# Altium footprint library Connectors THD.PcbLib: 631 footprints (part 43 of 46) (continued)
## TYCO_1888250-1 [mm] "1 Port, Yellow/Green LEDs, RJ45 10/100Base-T, Cat 5, Ethernet Connector Module" (continued)
Drill Drawing:
  lines w0.1: -9.25,-8.355 -9.25,5 9.245,5 9.245,-8.355 -7.08,-8.355 -9.25,-8.355
  text "PRESS-FIT TECHNOLOGY" at -8.5,-10 h1
  text "Daimeter Tolerance" at -6.5,-11.5 h1
  text "+0.05/-0.05" at -4.5,-13 h1
3D body: height 8.48, standoff -5.3, extent -9.245,-22.515 9.245,4.22

## TYCO_5103310-5 [mm] "20 Contacts - Right Angle Double-Row .100'' x .100'' Low Profile Four-Wall Header, AMP-LATCH Serie"
height 9.14
pads (20):
  round 1.7 hole 1: 1(-11.43,-1.27) 2(-11.43,1.27) 3(-8.89,-1.27) 4(-8.89,1.27) 5(-6.35,-1.27) 6(-6.35,1.27) 7(-3.81,-1.27) 8(-3.81,1.27) 9(-1.27,-1.27) 10(-1.27,1.27) 11(1.27,-1.27) 12(1.27,1.27) 13(3.81,-1.27) 14(3.81,1.27) 15(6.35,-1.27) 16(6.35,1.27) 17(8.89,-1.27) 18(8.89,1.27) 19(11.43,-1.27) 20(11.43,1.27)
Top Overlay:
  circle w0.3: c-13.2,-1.27 r0.15
  lines w0.2: -13.97,2.057 -12.7,4.257 -11.656,2.449 ; -12.336,2.057 -15.367,2.057 -15.367,1.016 -16.51,1.016 -16.51,10.871 16.51,10.871 16.51,1.016 15.367,1.016 15.367,2.057 12.336,2.057 ; -2.604,10.871 cw(c-2.604,10.363) -2.096,10.363 -2.095,4.14 ccw(c-1.333,4.14) -1.333,3.378 1.333,3.378 ccw(c1.333,4.14) 2.095,4.17 2.095,10.363 cw(c2.604,10.363) 2.604,10.871 ; -2.095,4.394 2.095,4.394 ; -1.581,4.394 -1.581,10.49 -0.959,10.49 -0.959,4.394 ; 0.959,4.394 0.959,10.49 1.581,10.49 1.581,4.394
  text "20" at 12.915,0.207 h1.02
Mechanical 8:
  lines w0.1: -11.93,-1.27 -11.43,-1.27 ; -11.93,1.27 -11.43,1.27 ; -11.43,-1.77 -11.43,-1.27 ; -11.43,-0.77 -11.43,-1.27 ; -11.43,0.77 -11.43,1.27 ; -11.43,1.77 -11.43,1.27 ; -10.93,-1.27 -11.43,-1.27 ; -10.93,1.27 -11.43,1.27 ; -9.39,-1.27 -8.89,-1.27 ; -9.39,1.27 -8.89,1.27 ; -8.89,-1.77 -8.89,-1.27 ; -8.89,-0.77 -8.89,-1.27 ; -8.89,0.77 -8.89,1.27 ; -8.89,1.77 -8.89,1.27 ; -8.39,-1.27 -8.89,-1.27 ; -8.39,1.27 -8.89,1.27 ; -6.85,-1.27 -6.35,-1.27 ; -6.85,1.27 -6.35,1.27 ; -6.35,-1.77 -6.35,-1.27 ; -6.35,-0.77 -6.35,-1.27 ; -6.35,0.77 -6.35,1.27 ; -6.35,1.77 -6.35,1.27 ; -5.85,-1.27 -6.35,-1.27 ; -5.85,1.27 -6.35,1.27 ; -4.31,-1.27 -3.81,-1.27 ; -4.31,1.27 -3.81,1.27 ; -3.81,-1.77 -3.81,-1.27 ; -3.81,-0.77 -3.81,-1.27 ; -3.81,0.77 -3.81,1.27 ; -3.81,1.77 -3.81,1.27 ; -3.31,-1.27 -3.81,-1.27 ; -3.31,1.27 -3.81,1.27 ; -1.77,-1.27 -1.27,-1.27 ; -1.77,1.27 -1.27,1.27 ; -1.27,-1.77 -1.27,-1.27 ; -1.27,-0.77 -1.27,-1.27 ; -1.27,0.77 -1.27,1.27 ; -1.27,1.77 -1.27,1.27 ; -0.77,-1.27 -1.27,-1.27 ; -0.77,1.27 -1.27,1.27 ; -0.5,0 0,0 ; 0,-0.5 0,0 ; 0,0.5 0,0 ; 0.5,0 0,0 ; 0.77,-1.27 1.27,-1.27 ; 0.77,1.27 1.27,1.27 ; 1.27,-1.77 1.27,-1.27 ; 1.27,-0.77 1.27,-1.27 ; 1.27,0.77 1.27,1.27 ; 1.27,1.77 1.27,1.27 ; 1.77,-1.27 1.27,-1.27 ; 1.77,1.27 1.27,1.27 ; 3.31,-1.27 3.81,-1.27 ; 3.31,1.27 3.81,1.27 ; 3.81,-1.77 3.81,-1.27 ; 3.81,-0.77 3.81,-1.27 ; 3.81,0.77 3.81,1.27 ; 3.81,1.77 3.81,1.27 ; 4.31,-1.27 3.81,-1.27 ; 4.31,1.27 3.81,1.27 ; 5.85,-1.27 6.35,-1.27 ; 5.85,1.27 6.35,1.27 ; 6.35,-1.77 6.35,-1.27 ; 6.35,-0.77 6.35,-1.27 ; 6.35,0.77 6.35,1.27 ; 6.35,1.77 6.35,1.27 ; 6.85,-1.27 6.35,-1.27 ; 6.85,1.27 6.35,1.27 ; 8.39,-1.27 8.89,-1.27 ; 8.39,1.27 8.89,1.27 ; 8.89,-1.77 8.89,-1.27 ; 8.89,-0.77 8.89,-1.27 ; 8.89,0.77 8.89,1.27 ; 8.89,1.77 8.89,1.27 ; 9.39,-1.27 8.89,-1.27 ; 9.39,1.27 8.89,1.27 ; 10.93,-1.27 11.43,-1.27 ; 10.93,1.27 11.43,1.27 ; 11.43,-1.77 11.43,-1.27 ; 11.43,-0.77 11.43,-1.27 ; 11.43,0.77 11.43,1.27 ; 11.43,1.77 11.43,1.27 ; 11.93,-1.27 11.43,-1.27 ; 11.93,1.27 11.43,1.27
Mechanical 14:
  circle w0.3: c-13.2,-1.27 r0.15
  lines w0.1: -13.97,2.057 -12.7,4.257 -11.43,2.057 ; -11.938,2.057 -11.938,1.676 -11.741,1.676 ; -11.741,2.057 -11.741,-1.581 -11.119,-1.581 -11.119,2.057 ; -11.119,1.676 -10.922,1.676 -10.922,2.057 ; -9.398,2.057 -9.398,1.676 -9.201,1.676 ; -9.201,2.057 -9.201,-1.581 -8.579,-1.581 -8.579,2.057 ; -8.579,1.676 -8.382,1.676 -8.382,2.057 ; -6.858,2.057 -6.858,1.676 -6.661,1.676 ; -6.661,2.057 -6.661,-1.581 -6.039,-1.581 -6.039,2.057 ; -6.039,1.676 -5.842,1.676 -5.842,2.057 ; -4.318,2.057 -4.318,1.676 -4.121,1.676 ; -4.121,2.057 -4.121,-1.581 -3.499,-1.581 -3.499,2.057 ; -3.499,1.676 -3.302,1.676 -3.302,2.057 ; -2.604,10.871 cw(c-2.604,10.363) -2.096,10.363 -2.095,4.14 ccw(c-1.333,4.14) -1.333,3.378 1.333,3.378 ccw(c1.333,4.14) 2.095,4.17 2.095,10.363 cw(c2.604,10.363) 2.604,10.871 ; -2.095,4.394 2.095,4.394 ; -1.778,2.057 -1.778,1.676 -1.581,1.676 ; -1.581,2.057 -1.581,-1.581 -0.959,-1.581 -0.959,2.057 ; -1.581,4.394 -1.581,10.49 -0.959,10.49 -0.959,4.394 ; -0.959,1.676 -0.762,1.676 -0.762,2.057 ; 0.762,2.057 0.762,1.676 0.959,1.676 ; 0.959,2.057 0.959,-1.581 1.581,-1.581 1.581,2.057 ; 0.959,4.394 0.959,10.49 1.581,10.49 1.581,4.394 ; 1.581,1.676 1.778,1.676 1.778,2.057 ; 3.302,2.057 3.302,1.676 3.499,1.676 ; 3.499,2.057 3.499,-1.581 4.121,-1.581 4.121,2.057 ; 4.121,1.676 4.318,1.676 4.318,2.057 ; 5.842,2.057 5.842,1.676 6.039,1.676 ; 6.039,2.057 6.039,-1.581 6.661,-1.581 6.661,2.057 ; 6.661,1.676 6.858,1.676 6.858,2.057 ; 8.382,2.057 8.382,1.676 8.579,1.676 ; 8.579,2.057 8.579,-1.581 9.201,-1.581 9.201,2.057 ; 9.201,1.676 9.398,1.676 9.398,2.057 ; 10.922,2.057 10.922,1.676 11.119,1.676 ; 11.119,2.057 11.119,-1.581 11.741,-1.581 11.741,2.057 ; 11.741,1.676 11.938,1.676 11.938,2.057 ; -16.51,1.016 -15.367,1.016 -15.367,2.057 15.367,2.057 15.367,1.016 16.51,1.016 16.51,10.871 -16.51,10.871 -16.51,1.016
  text "20" at 12.915,0.207 h1.02
3D body: height 9.14, standoff -3.43, extent -16.51,-1.581 16.51,10.871

## TYCO_5406203-3 [mm] "4 x RJ45 Jacks - 8 Positions"
height 13.64
pads (39):
  round 1.6 hole 0.9: 1A(-16.51,1.27) 1B(-2.54,1.27) 1C(11.43,1.27) 1D(25.4,1.27) 2A(-17.78,-1.27) 2B(-3.81,-1.27) 2C(10.16,-1.27) 2D(24.13,-1.27) 3A(-19.05,1.27) 3B(-5.08,1.27) 3C(8.89,1.27) 3D(22.86,1.27) 4A(-20.32,-1.27) 4B(-6.35,-1.27) 4C(7.62,-1.27) 4D(21.59,-1.27) 5A(-21.59,1.27) 5B(-7.62,1.27) 5C(6.35,1.27) 5D(20.32,1.27) 6A(-22.86,-1.27) 6B(-8.89,-1.27) 6C(5.08,-1.27) 6D(19.05,-1.27) 7A(-24.13,1.27) 7B(-10.16,1.27) 7C(3.81,1.27) 7D(17.78,1.27) 8A(-25.4,-1.27) 8B(-11.43,-1.27) 8C(2.54,-1.27) 8D(16.51,-1.27)
  round 1 hole 3.2 unplated mask+1.35: M1(26.67,7.62) M2(-26.67,7.62)
  round 2.3 hole 1.6: SH(-29.46,12.19) SH(-13.97,-2.792) SH(0,-2.792) SH(13.97,-2.792) SH(29.46,12.19)
Top Overlay:
  lines w0.2: -30.12,13.402 -30.505,15.499 -30.505,16.896 cw(c-29.845,16.946) -30.183,17.516 -29.591,17.93 ; -29.894,13.548 -30.256,15.499 -30.256,16.896 cw(c-29.757,16.9) -30.04,17.312 -29.591,17.626 ; -29.591,10.7 -29.591,0.894 -29.274,0.645 -29.274,0.513 -29.459,0.513 -29.459,-2.916 -15.4,-2.916 ; -29.591,13.616 -29.591,18.42 29.591,18.42 29.591,13.616 ; -29.459,-1.039 -29.68,-0.625 -29.68,-0.117 -29.459,-0.117 ; -29.21,-2.916 -29.21,0.513 ; -25.349,18.42 -25.349,10.165 -24.841,10.165 -24.841,18.014 -22.301,18.014 -22.301,10.165 -21.793,10.165 -21.793,18.42 ; -20.142,18.42 -20.142,10.165 -19.634,10.165 -19.634,18.014 -17.094,18.014 -17.094,10.165 -16.586,10.165 -16.586,18.42 ; -12.5,-2.916 -1.4,-2.916 ; -11.379,18.42 -11.379,10.165 -10.871,10.165 -10.871,18.014 -8.331,18.014 -8.331,10.165 -7.823,10.165 -7.823,18.42 ; -6.172,18.42 -6.172,10.165 -5.664,10.165 -5.664,18.014 -3.124,18.014 -3.124,10.165 -2.616,10.165 -2.616,18.42 ; 1.4,-2.916 12.6,-2.916 ; 2.592,18.42 2.592,10.165 3.1,10.165 3.1,18.014 5.64,18.014 5.64,10.165 6.148,10.165 6.148,18.42 ; 7.799,18.42 7.799,10.165 8.307,10.165 8.307,18.014 10.847,18.014 10.847,10.165 11.355,10.165 11.355,18.42 ; 15.4,-2.916 29.459,-2.916 29.459,0.513 29.274,0.513 29.274,0.645 29.591,0.894 29.591,10.7 ; 16.562,18.42 16.562,10.165 17.07,10.165 17.07,18.014 19.61,18.014 19.61,10.165 20.118,10.165 20.118,18.42 ; 21.769,18.42 21.769,10.165 22.277,10.165 22.277,18.014 24.817,18.014 24.817,10.165 25.325,10.165 25.325,18.42 ; 29.21,-2.916 29.21,0.513 ; 29.459,-1.039 29.68,-0.625 29.68,-0.117 29.459,-0.117 ; 29.591,17.626 30.04,17.312 cw(c29.757,16.9) 30.256,16.896 30.256,15.499 29.894,13.548 ; 29.591,17.93 30.183,17.516 cw(c29.845,16.946) 30.505,16.896 30.505,15.499 30.12,13.402
Mechanical 8:
  drawing of 156 lines, arcs and shapes, not listed
Mechanical 14:
  lines w0.1: -29.591,10.526 -30.505,15.499 -30.505,16.896 cw(c-29.845,16.946) -30.183,17.516 -29.591,17.93 ; -29.591,11.914 -30.256,15.499 -30.256,16.896 cw(c-29.757,16.9) -30.04,17.312 -29.591,17.626 ; -29.459,-1.039 -29.68,-0.625 -29.68,-0.117 -29.459,-0.117 ; -29.21,-2.916 -29.21,0.513 29.21,0.513 29.21,-2.916 ; -25.349,18.42 -25.349,10.165 -24.841,10.165 -24.841,18.014 -22.301,18.014 -22.301,10.165 -21.793,10.165 -21.793,18.42 ; -20.142,18.42 -20.142,10.165 -19.634,10.165 -19.634,18.014 -17.094,18.014 -17.094,10.165 -16.586,10.165 -16.586,18.42 ; -11.379,18.42 -11.379,10.165 -10.871,10.165 -10.871,18.014 -8.331,18.014 -8.331,10.165 -7.823,10.165 -7.823,18.42 ; -6.172,18.42 -6.172,10.165 -5.664,10.165 -5.664,18.014 -3.124,18.014 -3.124,10.165 -2.616,10.165 -2.616,18.42 ; 2.592,18.42 2.592,10.165 3.1,10.165 3.1,18.014 5.64,18.014 5.64,10.165 6.148,10.165 6.148,18.42 ; 7.799,18.42 7.799,10.165 8.307,10.165 8.307,18.014 10.847,18.014 10.847,10.165 11.355,10.165 11.355,18.42 ; 16.562,18.42 16.562,10.165 17.07,10.165 17.07,18.014 19.61,18.014 19.61,10.165 20.118,10.165 20.118,18.42 ; 21.769,18.42 21.769,10.165 22.277,10.165 22.277,18.014 24.817,18.014 24.817,10.165 25.325,10.165 25.325,18.42 ; 29.459,-1.039 29.68,-0.625 29.68,-0.117 29.459,-0.117 ; 29.591,10.526 30.505,15.499 30.505,16.896 ccw(c29.845,16.946) 30.183,17.516 29.591,17.93 ; 29.591,11.914 30.256,15.499 30.256,16.896 ccw(c29.757,16.9) 30.04,17.312 29.591,17.626 ; -29.591,0.894 29.591,0.894 ; -29.591,0.894 -29.591,18.42 29.591,18.42 29.591,0.894 ; -29.591,0.894 -29.274,0.645 ; -29.274,0.645 29.274,0.645 ; -29.274,0.645 -29.274,0.513 -29.459,0.513 -29.459,-2.916 29.459,-2.916 29.459,0.513 29.274,0.513 29.274,0.645 ; 29.274,0.645 29.591,0.894
Mechanical 15:
  lines w0.1: -0.25,0 0,0 ; 0,-0.25 0,0 ; 0,0.25 0,0 ; 0.25,0 0,0
3D body: height 14.55, standoff -3.94, extent -30.505,-2.916 30.505,18.42

## TYCO_5569260-1 [mm] "2 x 2 Port RJ45 Jacks"
height 26.29
pads (40):
  round 1.6 hole 0.9: 1LL(-11.43,-4.568) 1LR(2.54,-4.568) 1UL(-2.54,4.572) 1UR(11.43,4.572) 2LL(-10.16,-2.028) 2LR(3.81,-2.028) 2UL(-3.81,2.032) 2UR(10.16,2.032) 3LL(-8.89,-4.568) 3LR(5.08,-4.568) 3UL(-5.08,4.572) 3UR(8.89,4.572) 4LL(-7.62,-2.028) 4LR(6.35,-2.028) 4UL(-6.35,2.032) 4UR(7.62,2.032) 5LL(-6.35,-4.568) 5LR(7.62,-4.568) 5UL(-7.62,4.572) 5UR(6.35,4.572) 6LL(-5.08,-2.028) 6LR(8.89,-2.028) 6UL(-8.89,2.032) 6UR(5.08,2.032) 7LL(-3.81,-4.568) 7LR(10.16,-4.568) 7UL(-10.16,4.572) 7UR(3.81,4.572) 8LL(-2.54,-2.028) 8LR(11.43,-2.028) 8UL(-11.43,2.032) 8UR(2.54,2.032)
  round 1 hole 3.3 unplated mask+1.2: M1(12.7,-10.918) M2(-12.7,-10.918)
  round 2.3 hole 1.6: SH(-15.49,-15.488) SH(-15.49,4.572) SH(-14.732,-1.778) SH(14.73,-5.078) SH(15.488,0.512) SH(15.49,-15.488)
Top Overlay:
  lines w0.2: -15.621,-21.39 -16.2,-21.12 cw(c-15.88,-20.434) -16.637,-20.434 -16.637,-19.68 cw(c-15.88,-19.68) -16.314,-19.06 -15.838,-18.726 ccw(c-16.129,-18.31) -15.621,-18.31 ; -15.621,-21.116 -16.095,-20.895 cw(c-15.88,-20.434) -16.388,-20.434 -16.388,-19.68 cw(c-15.88,-19.68) -16.171,-19.264 -15.695,-18.93 ccw(c-16.129,-18.31) -15.621,-18.871 ; -15.621,-17.133 -15.621,-21.712 15.621,-21.712 15.621,-17.133 ; -15.621,-13.843 -15.621,-3.168 ; -15.621,-0.388 -15.621,2.927 ; -15.621,6.217 -15.621,6.736 15.621,6.736 15.621,2.157 ; -1.714,-21.712 -1.714,-13.965 -1.27,-13.965 -1.27,-21.509 1.27,-21.509 1.27,-13.965 1.714,-13.965 1.714,-21.712 ; 15.621,-21.39 16.2,-21.12 ccw(c15.88,-20.434) 16.637,-20.434 16.637,-19.68 ccw(c15.88,-19.68) 16.314,-19.06 15.838,-18.726 cw(c16.129,-18.31) 15.621,-18.31 ; 15.621,-21.116 16.095,-20.895 ccw(c15.88,-20.434) 16.388,-20.434 16.388,-19.68 ccw(c15.88,-19.68) 16.171,-19.264 15.695,-18.93 cw(c16.129,-18.31) 15.621,-18.871 ; 15.621,-13.843 15.621,-6.467 ; 15.621,-3.689 15.621,-1.133
Mechanical 8:
  drawing of 178 lines, arcs and shapes, not listed
Mechanical 14:
  lines w0.1: -15.621,-21.39 -16.2,-21.12 cw(c-15.88,-20.434) -16.637,-20.434 -16.637,-19.68 cw(c-15.88,-19.68) -16.314,-19.06 -15.838,-18.726 ccw(c-16.129,-18.31) -15.621,-18.31 ; -15.621,-21.116 -16.095,-20.895 cw(c-15.88,-20.434) -16.388,-20.434 -16.388,-19.68 cw(c-15.88,-19.68) -16.171,-19.264 -15.695,-18.93 ccw(c-16.129,-18.31) -15.621,-18.871 ; -1.714,-21.712 -1.714,-13.965 1.714,-13.965 1.714,-21.712 ; -1.27,-13.965 -1.27,-21.509 1.27,-21.509 1.27,-13.965 ; 15.621,-21.39 16.2,-21.12 ccw(c15.88,-20.434) 16.637,-20.434 16.637,-19.68 ccw(c15.88,-19.68) 16.314,-19.06 15.838,-18.726 cw(c16.129,-18.31) 15.621,-18.31 ; 15.621,-21.116 16.095,-20.895 ccw(c15.88,-20.434) 16.388,-20.434 16.388,-19.68 ccw(c15.88,-19.68) 16.171,-19.264 15.695,-18.93 cw(c16.129,-18.31) 15.621,-18.871 ; -15.621,-21.712 -15.621,6.736 15.621,6.736 15.621,-21.712 -15.621,-21.712
3D body: height 26.29, standoff -4.06, extent -16.637,-21.712 16.637,6.736

## TYCO_5650870-4 [mm] "DIN 41612 Class 2, Type R, Thru-Hole; Rows a+c, 64 Positions, Performance level 2, Lead 2.79mm, Right Angle Female Connector"
height 9.11
pads (66):
  round 1.7 hole 1: a1(0,0) a2(0,-2.54) a3(0,-5.08) a4(0,-7.62) a5(0,-10.16) a6(0,-12.7) a7(0,-15.24) a8(0,-17.78) a9(0,-20.32) a10(0,-22.86) a11(0,-25.4) a12(0,-27.94) a13(0,-30.48) a14(0,-33.02) a15(0,-35.56) a16(0,-38.1) a17(0,-40.64) a18(0,-43.18) a19(0,-45.72) a20(0,-48.26) a21(0,-50.8) a22(0,-53.34) a23(0,-55.88) a24(0,-58.42) a25(0,-60.96) a26(0,-63.5) a27(0,-66.04) a28(0,-68.58) a29(0,-71.12) a30(0,-73.66) a31(0,-76.2) a32(0,-78.74) c1(-5.08,0) c2(-5.08,-2.54) c3(-5.08,-5.08) c4(-5.08,-7.62) c5(-5.08,-10.16) c6(-5.08,-12.7) c7(-5.08,-15.24) c8(-5.08,-17.78) c9(-5.08,-20.32) c10(-5.08,-22.86) c11(-5.08,-25.4) c12(-5.08,-27.94) c13(-5.08,-30.48) c14(-5.08,-33.02) c15(-5.08,-35.56) c16(-5.08,-38.1) c17(-5.08,-40.64) c18(-5.08,-43.18) c19(-5.08,-45.72) c20(-5.08,-48.26) c21(-5.08,-50.8) c22(-5.08,-53.34) c23(-5.08,-55.88) c24(-5.08,-58.42) c25(-5.08,-60.96) c26(-5.08,-63.5) c27(-5.08,-66.04) c28(-5.08,-68.58) c29(-5.08,-71.12) c30(-5.08,-73.66) c31(-5.08,-76.2) c32(-5.08,-78.74)
  round 3.5 / inner round 3.5 / far side round 5.1 hole 2.8: MTG1(2.54,5.08) MTG2(2.54,-83.82)
Top Overlay:
  lines w0.2: -5.01,-79.988 -5.01,-80.685 -3.76,-80.685 -3.76,-81 -0.06,-81 -0.06,-86.36 6.14,-86.36 6.14,7.62 -0.06,7.62 -0.06,2.26 -3.76,2.26 -3.76,1.945 -5.01,1.945 -5.01,1.248 ; -3.839,-78.89 -1.241,-78.89 ; -3.839,0.15 -1.241,0.15 ; 1.241,-78.89 1.64,-78.89 ; 1.241,0.15 1.64,0.15 ; 4.64,-86.36 4.64,-85.163 5.415,-83.82 3.978,-81.33 1.64,-81.33 1.64,2.59 3.978,2.59 5.415,5.08 4.64,6.423 4.64,7.62 ; 4.64,-82.477 4.64,3.737 ; 6.14,-81.82 12.03,-81.82 ; 6.14,-80.78 12.03,-80.78 12.64,-80.17 ; 6.14,2.04 12.03,2.04 12.64,1.43 ; 6.14,3.08 12.03,3.08 ; 12.03,-81.82 12.03,3.08 ; 12.03,-81.82 12.64,-81.21 12.64,2.47 12.03,3.08
  text "1" at -7.045,-0.55 h1.2
  text "c" at -4.055,2.865 h1.2
  text "a" at -0.8,2.915 h1.2
  text "32" at -8.57,-79.39 h1.2
  text "5" at -7.445,-10.86 h1.2
  text "10" at -8.495,-23.51 h1.2
  text "15" at -8.47,-36.11 h1.2
  text "20" at -8.57,-48.91 h1.2
  text "25" at -8.57,-61.61 h1.2
  text "30" at -8.57,-74.31 h1.2
Mechanical 8:
  drawing of 267 lines, arcs and shapes, not listed
  text "PCB" at 5.08,-41.275 h1.2
Mechanical 14:
  lines w0.1: -5.01,-78.89 -5.01,-80.685 -3.76,-80.685 -3.76,-81 -0.06,-81 -0.06,-86.36 6.14,-86.36 6.14,7.62 -0.06,7.62 -0.06,2.26 -3.76,2.26 -3.76,1.945 -5.01,1.945 -5.01,0.15 ; 1.64,-78.89 -5.72,-78.89 -5.72,0.15 1.64,0.15 ; 4.64,-86.36 4.64,-85.163 5.415,-83.82 3.978,-81.33 1.64,-81.33 1.64,2.59 3.978,2.59 5.415,5.08 4.64,6.423 4.64,7.62 ; 4.64,-82.477 4.64,3.737 ; 6.14,-81.82 12.03,-81.82 ; 6.14,-80.78 12.03,-80.78 12.64,-80.17 ; 6.14,2.04 12.03,2.04 12.64,1.43 ; 6.14,3.08 12.03,3.08 ; 12.03,-81.82 12.03,3.08 ; 12.03,-81.82 12.64,-81.21 12.64,2.47 12.03,3.08 ; 1.005,-84.16 1.005,-83.48 1.316,-83.48 cw(c2.54,-83.82) 3.764,-83.48 4.075,-83.48 4.075,-84.16 3.764,-84.16 cw(c2.54,-83.82) 1.316,-84.16 1.005,-84.16 ; 1.005,4.74 1.316,4.74 ccw(c2.54,5.08) 3.764,4.74 4.075,4.74 4.075,5.42 3.764,5.42 ccw(c2.54,5.08) 1.316,5.42 1.005,5.42 1.005,4.74
  text "1" at -7.045,-0.55 h1.2
  text "c" at -4.055,2.865 h1.2
  text "a" at -0.8,2.915 h1.2
  text "32" at -8.57,-79.39 h1.2
  text "5" at -7.445,-10.86 h1.2
  text "10" at -8.495,-23.51 h1.2
  text "15" at -8.47,-36.11 h1.2
  text "20" at -8.57,-48.91 h1.2
  text "25" at -8.57,-61.61 h1.2
  text "30" at -8.57,-74.31 h1.2
3D body: height 9.11, standoff -2.79, extent -5.72,-86.36 12.64,7.62

## TYCO_5650933-5 [mm] "DIN 41612, Type C,  Thru-Hole; Rows a+c, 64 Position, Performance level 2, Lead 3mm, Pitch 2.54mm, Straight Male Connector"
height 11.51
pads (66):
  round 1.7 hole 1: a1(0,0) a2(0,-2.54) a3(0,-5.08) a4(0,-7.62) a5(0,-10.16) a6(0,-12.7) a7(0,-15.24) a8(0,-17.78) a9(0,-20.32) a10(0,-22.86) a11(0,-25.4) a12(0,-27.94) a13(0,-30.48) a14(0,-33.02) a15(0,-35.56) a16(0,-38.1) a17(0,-40.64) a18(0,-43.18) a19(0,-45.72) a20(0,-48.26) a21(0,-50.8) a22(0,-53.34) a23(0,-55.88) a24(0,-58.42) a25(0,-60.96) a26(0,-63.5) a27(0,-66.04) a28(0,-68.58) a29(0,-71.12) a30(0,-73.66) a31(0,-76.2) a32(0,-78.74) c1(5.08,0) c2(5.08,-2.54) c3(5.08,-5.08) c4(5.08,-7.62) c5(5.08,-10.16) c6(5.08,-12.7) c7(5.08,-15.24) c8(5.08,-17.78) c9(5.08,-20.32) c10(5.08,-22.86) c11(5.08,-25.4) c12(5.08,-27.94) c13(5.08,-30.48) c14(5.08,-33.02) c15(5.08,-35.56) c16(5.08,-38.1) c17(5.08,-40.64) c18(5.08,-43.18) c19(5.08,-45.72) c20(5.08,-48.26) c21(5.08,-50.8) c22(5.08,-53.34) c23(5.08,-55.88) c24(5.08,-58.42) c25(5.08,-60.96) c26(5.08,-63.5) c27(5.08,-66.04) c28(5.08,-68.58) c29(5.08,-71.12) c30(5.08,-73.66) c31(5.08,-76.2) c32(5.08,-78.74)
  round 3.5 / inner round 3.5 / far side round 5.1 hole 2.8: MTG1(2.24,5.64) MTG2(2.24,-84.36)
Top Overlay:
  lines w0.2: -2.195,-83.612 -0.735,-83.612 0.3,-81.82 3.73,-81.82 4.645,-83.405 8.04,-83.405 8.04,4.685 4.645,4.685 ; -2.195,-83.405 -2.195,-86.795 6.285,-86.795 6.285,-85.905 7.275,-85.545 7.275,-84.655 6.285,-84.294 6.285,-83.405 ; -2.195,4.685 -2.195,7.055 -1.175,8.075 6.285,8.075 6.285,7.185 7.275,6.825 7.275,5.935 6.285,5.575 6.285,4.685 ; -2.195,4.892 -0.735,4.892 0.3,3.1 3.73,3.1 5.197,5.64 5.197,8.075 ; -0.615,-83.405 -2.96,-83.405 -2.96,4.685 -0.615,4.685 ; -0.188,-82.665 -2.49,-82.665 ; -0.188,3.945 -2.49,3.945 ; 0.193,-82.005 -1.83,-82.005 ; 0.193,3.285 -1.83,3.285 ; 3.837,-82.005 4.5,-82.005 ; 3.837,3.285 4.5,3.285 ; 4.218,-82.665 5.16,-82.665 ; 4.218,3.945 5.16,3.945 ; -2.49,-82.665 -2.49,3.945 ; -2.49,-82.665 -1.83,-82.005 ; -2.49,3.945 -1.83,3.285 ; -1.83,-82.005 -1.83,3.285 ; 4.5,-82.005 4.5,-81.065 ; 4.5,-82.005 5.16,-82.665 ; 4.5,-81.065 5.16,-81.725 ; 4.5,-81.065 6.91,-81.065 ; 4.5,2.345 6.91,2.345 ; 4.5,2.345 5.16,3.005 ; 4.5,2.345 4.5,3.285 ; 4.5,3.285 5.16,3.945 ; 5.16,-82.665 5.16,-81.725 ; 5.16,-81.725 7.57,-81.725 ; 5.16,3.005 7.57,3.005 ; 5.16,3.005 5.16,3.945 ; 6.91,-81.065 6.91,2.345 ; 6.91,-81.065 7.57,-81.725 ; 6.91,2.345 7.57,3.005 ; 7.57,-81.725 7.57,3.005
  text "10" at -5.475,-23.46 h1.2
  text "c" at 2.995,1.37 h1.2
  text "a" at -0.4,1.445 h1.2
  text "32" at -5.675,-79.365 h1.2
  text "5" at -4.55,-10.835 h1.2
  text "30" at -5.675,-74.285 h1.2
  text "25" at -5.675,-61.585 h1.2
  text "20" at -5.675,-48.885 h1.2
  text "15" at -5.475,-36.135 h1.2
  text "1" at -4.075,-0.675 h1.2
Mechanical 8:
  drawing of 264 lines, arcs and shapes, not listed
Mechanical 14:
  drawing of 700 lines, arcs and shapes, not listed
  text "10" at -5.475,-23.46 h1.2
  text "32" at -5.675,-79.365 h1.2
  text "5" at -4.55,-10.835 h1.2
  text "30" at -5.675,-74.285 h1.2
  text "25" at -5.675,-61.585 h1.2
  text "20" at -5.675,-48.885 h1.2
  text "15" at -5.475,-36.135 h1.2
  text "1" at -4.075,-0.675 h1.2
  text "a" at -0.4,1.445 h1.2
  text "c" at -1.445,5.06 h1.2
3D body: height 11.51, standoff -3.3, extent -2.96,-86.795 8.04,8.075

## TYCO_5747844-5 [mm] "Right Angle 9 Female Contacts D-SUB Connector With PCB Mount Retention , Grounding Straps, and Fixed UNC 4-40 Female Screwlocks"
height 12.92
pads (11):
  round 1.5 hole 0.9: 1(-5.48,-1.422) 2(-2.74,-1.422) 3(0,-1.422) 4(2.74,-1.422) 5(5.48,-1.422) 6(-4.11,1.422) 7(-1.37,1.422) 8(1.37,1.422) 9(4.11,1.422)
  round 5.5 hole 3.2 unplated: 10(-12.495,0)
  round 5.5 hole 3.2: 11(12.495,0)
Top Overlay:
  lines w0.2: -15.494,5.679 15.494,5.679 ; -15.494,6.645 15.494,6.645 ; -15.494,9.108 15.494,9.108 ; -15.011,5.679 -15.011,4.79 -9.982,4.79 -9.982,5.679 ; -14.402,9.525 -14.402,15.408 -10.592,15.408 -10.592,9.525 ; -14.084,6.645 -14.084,7.838 -13.576,7.838 ; -13.576,9.108 -13.576,7.422 -11.417,7.422 -11.417,9.108 ; -11.417,7.838 -10.909,7.838 -10.909,6.645 ; -8.153,5.679 -8.153,-2.169 -6.482,-2.169 ; -8.1,9.525 -8.1,15.296 cw(c-7.8,15.296) -7.8,15.596 7.8,15.596 cw(c7.8,15.296) 8.1,15.296 8.1,9.525 ; -7.899,-2.169 -7.899,-3.185 -15.494,-3.185 -15.494,9.525 15.494,9.525 15.494,-3.185 7.899,-3.185 7.899,-2.169 ; -4.478,-2.169 -3.742,-2.169 ; -1.738,-2.169 -1.002,-2.169 ; 1.002,-2.169 1.738,-2.169 ; 3.742,-2.169 4.478,-2.169 ; 6.482,-2.169 8.153,-2.169 8.153,5.679 ; 9.982,5.679 9.982,4.79 15.011,4.79 15.011,5.679 ; 10.592,9.525 10.592,15.408 14.402,15.408 14.402,9.525 ; 10.909,6.645 10.909,7.838 11.417,7.838 ; 11.417,9.108 11.417,7.422 13.576,7.422 13.576,9.108 ; 13.576,7.838 14.084,7.838 14.084,6.645
  text "6" at -6.375,0.925 h1.2
  text "5" at 6.85,-1.575 h1.2
  text "1" at -7.35,-1.575 h1.2
  text "9" at 5.75,0.925 h1.2
Mechanical 8:
  circle w0.1: c-12.495,0 r1.6
  circle w0.1: c12.495,0 r1.6
  circle w0.1: c-4.11,1.422 r0.5
  circle w0.1: c-5.48,-1.422 r0.5
  circle w0.1: c4.11,1.422 r0.5
  circle w0.1: c5.48,-1.422 r0.5
  lines w0.1: -12.995,0 -12.495,0 ; -12.495,-0.5 -12.495,0 ; -12.495,0.5 -12.495,0 ; -11.995,0 -12.495,0 ; -5.98,-1.422 -5.48,-1.422 ; -5.48,-1.922 -5.48,-1.422 ; -5.48,-0.922 -5.48,-1.422 ; -4.98,-1.422 -5.48,-1.422 ; -4.61,1.422 -4.11,1.422 ; -4.11,0.922 -4.11,1.422 ; -4.11,1.922 -4.11,1.422 ; -3.61,1.422 -4.11,1.422 ; -3.24,-1.422 -2.74,-1.422 ; -2.74,-1.922 -2.74,-1.422 ; -2.74,-0.922 -2.74,-1.422 ; -2.24,-1.422 -2.74,-1.422 ; -1.87,1.422 -1.37,1.422 ; -1.37,0.922 -1.37,1.422 ; -1.37,1.922 -1.37,1.422 ; -0.87,1.422 -1.37,1.422 ; -0.5,-1.422 0,-1.422 ; -0.5,0 0,0 ; 0,-1.922 0,-1.422 ; 0,-0.922 0,-1.422 ; 0,-0.5 0,0 ; 0,0.5 0,0 ; 0.5,-1.422 0,-1.422 ; 0.5,0 0,0 ; 0.87,1.422 1.37,1.422 ; 1.37,0.922 1.37,1.422 ; 1.37,1.922 1.37,1.422 ; 1.87,1.422 1.37,1.422 ; 2.24,-1.422 2.74,-1.422 ; 2.74,-1.922 2.74,-1.422 ; 2.74,-0.922 2.74,-1.422 ; 3.24,-1.422 2.74,-1.422 ; 3.61,1.422 4.11,1.422 ; 4.11,0.922 4.11,1.422 ; 4.11,1.922 4.11,1.422 ; 4.61,1.422 4.11,1.422 ; 4.98,-1.422 5.48,-1.422 ; 5.48,-1.922 5.48,-1.422 ; 5.48,-0.922 5.48,-1.422 ; 5.98,-1.422 5.48,-1.422 ; 11.995,0 12.495,0 ; 12.495,-0.5 12.495,0 ; 12.495,0.5 12.495,0 ; 12.995,0 12.495,0
Mechanical 14:
  circle w0.1: c-12.497,0 r1.854
  circle w0.1: c-12.497,0 r1.549
  circle w0.1: c12.497,0 r1.854
  circle w0.1: c12.497,0 r1.549
  lines w0.1: -15.494,5.679 15.494,5.679 ; -15.494,6.645 15.494,6.645 ; -15.494,9.108 15.494,9.108 ; -15.011,5.679 -15.011,4.79 -9.982,4.79 -9.982,5.679 ; -14.402,9.525 -14.402,15.408 -10.592,15.408 -10.592,9.525 ; -14.084,6.645 -14.084,7.838 -13.576,7.838 ; -13.576,9.108 -13.576,7.422 -11.417,7.422 -11.417,9.108 ; -11.417,7.838 -10.909,7.838 -10.909,6.645 ; -8.153,5.679 -8.153,-2.169 8.153,-2.169 8.153,5.679 ; -8.1,9.525 -8.1,15.296 cw(c-7.8,15.296) -7.8,15.596 7.8,15.596 cw(c7.8,15.296) 8.1,15.296 8.1,9.525 ; -7.899,-2.169 -7.899,-3.185 -15.494,-3.185 -15.494,9.525 15.494,9.525 15.494,-3.185 7.899,-3.185 7.899,-2.169 ; 9.982,5.679 9.982,4.79 15.011,4.79 15.011,5.679 ; 10.592,9.525 10.592,15.408 14.402,15.408 14.402,9.525 ; 10.909,6.645 10.909,7.838 11.417,7.838 ; 11.417,9.108 11.417,7.422 13.576,7.422 13.576,9.108 ; 13.576,7.838 14.084,7.838 14.084,6.645
  text "9" at 5.75,0.925 h1.2
  text "1" at -7.35,-1.575 h1.2
  text "5" at 6.85,-1.575 h1.2
  text "6" at -6.375,0.925 h1.2
3D body: height 12.55, standoff -3.26, extent -15.494,-3.185 15.494,15.71